# Altium footprint library u025Library.PcbLib: 132 footprints (part 3 of 9)
Each footprint in its own frame and in the unit in brackets; x right, y up, seen from the top. Pads: shape width x height; smd on the part's side, far side on the other; paste and mask are expansions set on the pad; w line width, h text height; cw(c..) or ccw(c..) is an arc to the next point about the centre after c.
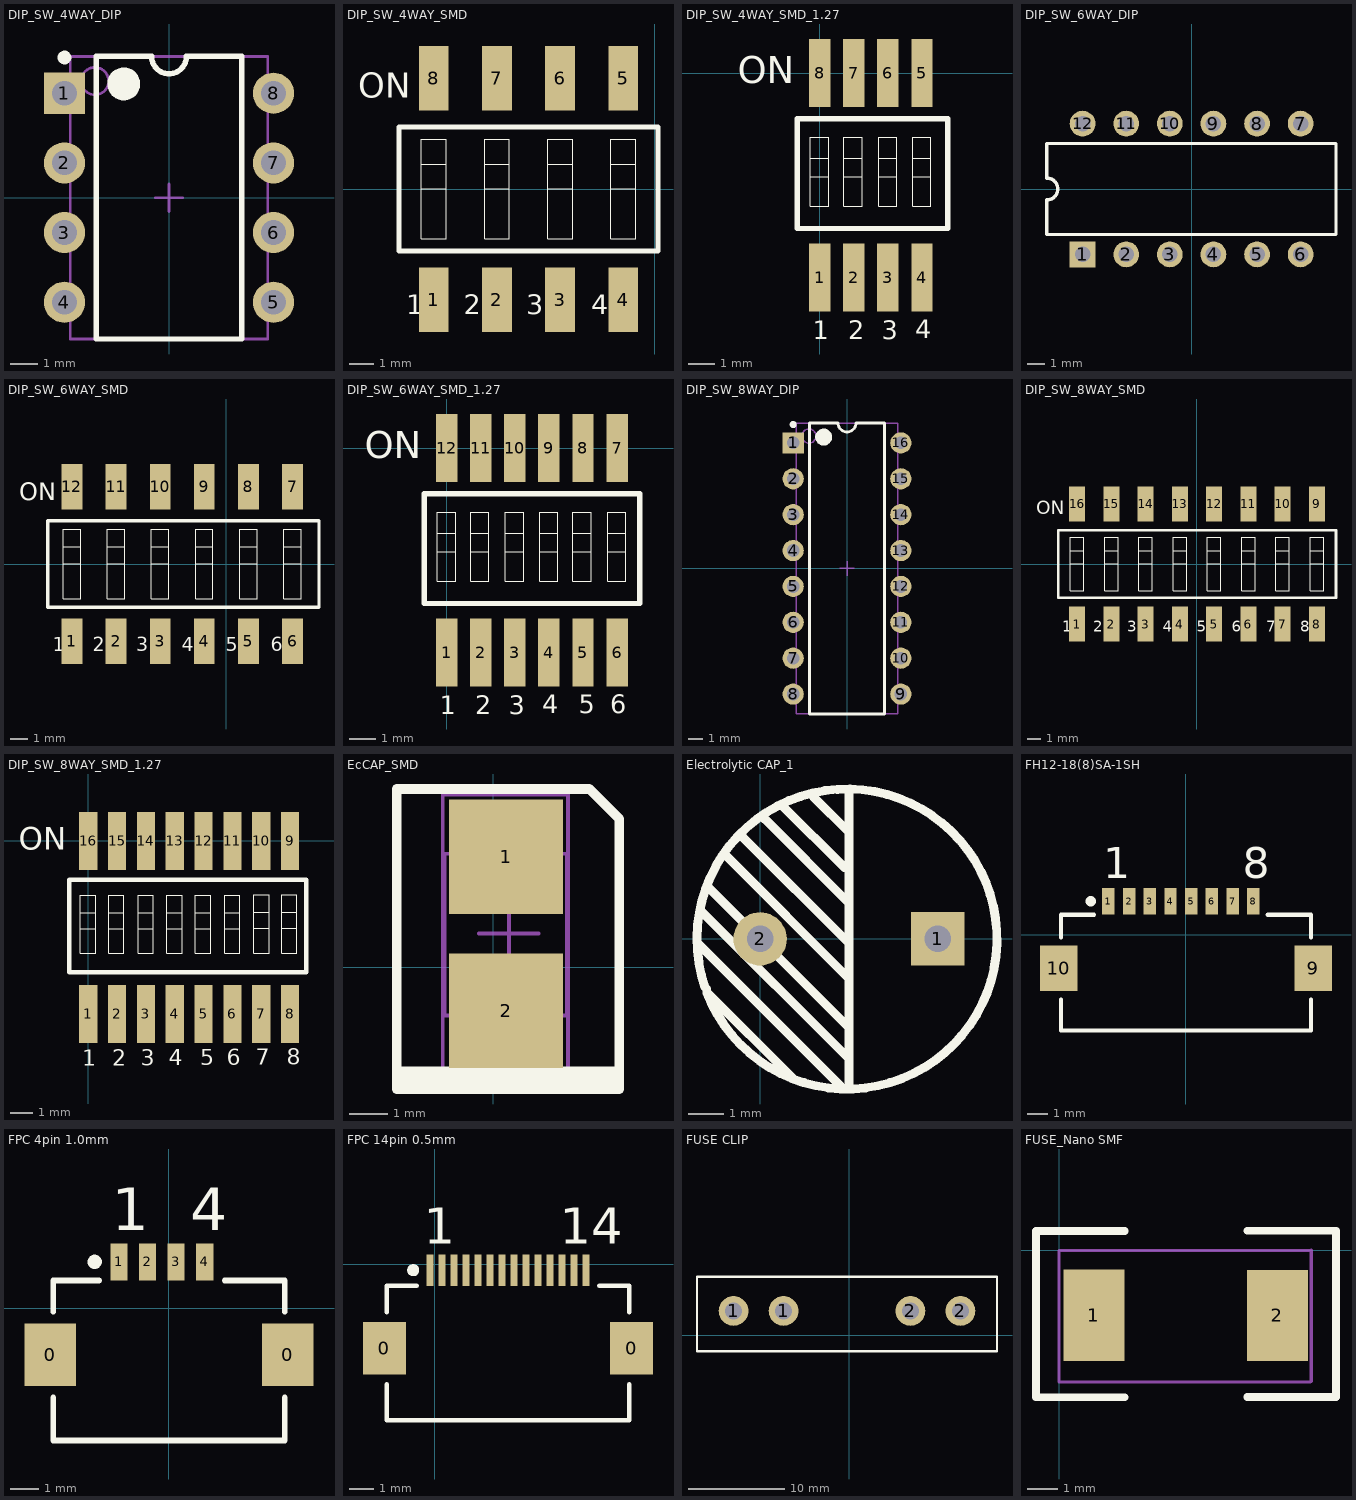
[diagram p2: the footprints below, top view; thin cyan lines are the x and y axes]

## DIP_SW_4WAY_DIP [mm] "DIP; 4 Leads; Row Spacing 7.62 mm; Pitch 2.54 mm"
height 5.08
pads (8):
  rect 1.5x1.5 hole 0.9: 1(-3.81,3.81)
  round 1.5 hole 0.9: 2(-3.81,1.27) 3(-3.81,-1.27) 4(-3.81,-3.81) 5(3.81,-3.81) 6(3.81,-1.27) 7(3.81,1.27) 8(3.81,3.81)
Top Overlay:
  circle w0.25: c-3.81,5.11 r0.125
  circle w0.6: c-1.65,4.15 r0.3
  lines w0.2: -2.65,-5.15 -2.65,5.15 -0.635,5.15 ccw(c0,5.15) 0.635,5.15 2.65,5.15 2.65,-5.15 -2.65,-5.15
Mechanical 13:
  circle w0.1: c-2.7,4.25 r0.5
  lines w0.1: -3.6,-5.15 -3.6,5.15 3.6,5.15 3.6,-5.15 -3.6,-5.15
Mechanical 15:
  lines w0.1: -0.5,0 0.5,0 ; 0,-0.5 0,0.5
3D body: height 3.3, standoff -0.9, extent -3.886,-5.029 3.734,5.131

## DIP_SW_4WAY_SMD [mm] "DIP Switch; 8 Leads"
height 5.06
pads (8):
  rect 1.2x2.6 smd: 1(-8.89,-4.45) 2(-6.35,-4.45) 3(-3.81,-4.45) 4(-1.27,-4.45) 5(-1.27,4.45) 6(-3.81,4.45) 7(-6.35,4.45) 8(-8.89,4.45)
Top Overlay:
  lines w0.025: -9.39,0 -8.39,0 ; -9.39,1 -8.39,1 ; -6.85,0 -5.85,0 ; -6.85,1 -5.85,1 ; -4.31,0 -3.31,0 ; -4.31,1 -3.31,1 ; -1.77,0 -0.77,0 ; -1.77,1 -0.77,1 ; -9.39,-2 -9.39,2 -8.39,2 -8.39,-2 -9.39,-2 ; -6.85,-2 -6.85,2 -5.85,2 -5.85,-2 -6.85,-2 ; -4.31,-2 -4.31,2 -3.31,2 -3.31,-2 -4.31,-2 ; -1.77,-2 -1.77,2 -0.77,2 -0.77,-2 -1.77,-2
  lines w0.2: -10.29,-2.5 -10.29,2.5 0.127,2.5 0.127,-2.5 -10.29,-2.5
  text "4" at -2.556,-5.032 h0.8
  text "3" at -5.181,-5.032 h0.8
  text "2" at -7.681,-5.032 h0.8
  text "1" at -10.006,-5.032 h0.8
  text "ON" at -11.938,3.678 h1
3D body: height 4.32, standoff 0.05, extent -10.793,-4.955 0.837,4.955

## DIP_SW_4WAY_SMD_1.27 [mm] "DIP Switch; 8 Leads"
height 5.06
pads (8):
  rect 0.8x2.54 smd: 1(0,-7.62) 2(1.27,-7.62) 3(2.54,-7.62) 4(3.81,-7.62) 5(3.81,0) 6(2.54,0) 7(1.27,0) 8(0,0)
Top Overlay:
  lines w0.025: -0.348,-3.861 0.33,-3.861 ; -0.348,-3.166 0.33,-3.166 ; 0.897,-3.861 1.575,-3.861 ; 0.897,-3.166 1.575,-3.166 ; 2.192,-3.861 2.87,-3.861 ; 2.192,-3.166 2.87,-3.166 ; 3.462,-3.861 4.14,-3.861 ; 3.462,-3.166 4.14,-3.166 ; -0.348,-4.953 0.33,-4.953 0.33,-2.388 -0.348,-2.388 -0.348,-4.953 ; 0.897,-4.953 1.575,-4.953 1.575,-2.388 0.897,-2.388 0.897,-4.953 ; 2.192,-4.953 2.87,-4.953 2.87,-2.388 2.192,-2.388 2.192,-4.953 ; 3.462,-4.953 3.462,-2.388 4.14,-2.388 4.14,-4.953 3.462,-4.953
  lines w0.2: -0.838,-5.791 -0.838,-1.702 4.775,-1.702 4.775,-5.791 -0.838,-5.791
  text "1" at -0.254,-9.906 h0.7
  text "ON" at -3.048,-0.381 h1
  text "2" at 1.067,-9.906 h0.7
  text "3" at 2.311,-9.906 h0.7
  text "4" at 3.556,-9.881 h0.7
3D body: height 2.35, standoff 0, extent -1.124,-7.8 5.086,0.333

## DIP_SW_6WAY_DIP [mm] "DIP; 12 Leads; Row Spacing 7.62 mm; Pitch 2.54 mm"
height 5.8
pads (12):
  rect 1.5x1.5 hole 0.9: 1(-6.35,-3.81)
  round 1.5 hole 0.9: 2(-3.81,-3.81) 3(-1.27,-3.81) 4(1.27,-3.81) 5(3.81,-3.81) 6(6.35,-3.81) 7(6.35,3.81) 8(3.81,3.81) 9(1.27,3.81) 10(-1.27,3.81) 11(-3.81,3.81) 12(-6.35,3.81)
Top Overlay:
  lines w0.2: -8.43,-2.65 8.41,-2.65 8.41,2.65 -8.43,2.65 -8.43,0.635 cw(c-8.43,0) -8.43,-0.635 -8.43,-2.65
3D body: height 3.3, standoff -0.9, extent -7.569,-3.785 7.671,3.835

## DIP_SW_6WAY_SMD [mm] "DIP Switch; 12 Leads"
height 5.06
pads (12):
  rect 1.2x2.6 smd: 1(-8.89,-4.45) 2(-6.35,-4.45) 3(-3.81,-4.45) 4(-1.27,-4.45) 5(1.27,-4.45) 6(3.81,-4.45) 7(3.81,4.45) 8(1.27,4.45) 9(-1.27,4.45) 10(-3.81,4.45) 11(-6.35,4.45) 12(-8.89,4.45)
Top Overlay:
  lines w0.025: -9.39,0 -8.39,0 ; -9.39,1 -8.39,1 ; -6.85,0 -5.85,0 ; -6.85,1 -5.85,1 ; -4.31,0 -3.31,0 ; -4.31,1 -3.31,1 ; -1.77,0 -0.77,0 ; -1.77,1 -0.77,1 ; 0.77,0 1.77,0 ; 0.77,1 1.77,1 ; 3.31,0 4.31,0 ; 3.31,1 4.31,1 ; -9.39,-2 -9.39,2 -8.39,2 -8.39,-2 -9.39,-2 ; -6.85,-2 -6.85,2 -5.85,2 -5.85,-2 -6.85,-2 ; -4.31,-2 -4.31,2 -3.31,2 -3.31,-2 -4.31,-2 ; -1.77,-2 -1.77,2 -0.77,2 -0.77,-2 -1.77,-2 ; 0.77,-2 0.77,2 1.77,2 1.77,-2 0.77,-2 ; 3.31,-2 3.31,2 4.31,2 4.31,-2 3.31,-2
  lines w0.2: -10.29,-2.5 -10.29,2.5 5.334,2.5 5.334,-2.5 -10.29,-2.5
  text "6" at 2.569,-5.032 h0.8
  text "5" at -0.031,-5.032 h0.8
  text "4" at -2.556,-5.032 h0.8
  text "3" at -5.181,-5.032 h0.8
  text "2" at -7.681,-5.032 h0.8
  text "1" at -10.006,-5.032 h0.8
  text "ON" at -11.938,3.678 h1
3D body: height 4.3, standoff 0.1, extent -10.185,-3.734 5.055,3.886

## DIP_SW_6WAY_SMD_1.27 [mm] "DIP Switch; 12 Leads"
height 5.06
pads (12):
  rect 0.8x2.54 smd: 1(0,-7.62) 2(1.27,-7.62) 3(2.54,-7.62) 4(3.81,-7.62) 5(5.08,-7.62) 6(6.35,-7.62) 7(6.35,0) 8(5.08,0) 9(3.81,0) 10(2.54,0) 11(1.27,0) 12(0,0)
Top Overlay:
  lines w0.025: -0.348,-3.861 0.33,-3.861 ; -0.348,-3.166 0.33,-3.166 ; 0.897,-3.861 1.575,-3.861 ; 0.897,-3.166 1.575,-3.166 ; 2.192,-3.861 2.87,-3.861 ; 2.192,-3.166 2.87,-3.166 ; 3.462,-3.861 4.14,-3.861 ; 3.462,-3.166 4.14,-3.166 ; 4.707,-3.861 5.385,-3.861 ; 4.707,-3.166 5.385,-3.166 ; 6.002,-3.861 6.68,-3.861 ; 6.002,-3.166 6.68,-3.166 ; -0.348,-4.953 -0.348,-2.388 0.33,-2.388 0.33,-4.953 -0.348,-4.953 ; 0.897,-4.953 0.897,-2.388 1.575,-2.388 1.575,-4.953 0.897,-4.953 ; 2.192,-4.953 2.192,-2.388 2.87,-2.388 2.87,-4.953 2.192,-4.953 ; 3.462,-4.953 4.14,-4.953 4.14,-2.388 3.462,-2.388 3.462,-4.953 ; 4.707,-4.953 5.385,-4.953 5.385,-2.388 4.707,-2.388 4.707,-4.953 ; 6.002,-4.953 6.68,-4.953 6.68,-2.388 6.002,-2.388 6.002,-4.953
  lines w0.2: -0.838,-5.791 7.188,-5.791 7.188,-1.702 -0.838,-1.702 -0.838,-5.791
  text "5" at 4.928,-9.881 h0.7
  text "6" at 6.096,-9.881 h0.7
  text "4" at 3.556,-9.881 h0.7
  text "3" at 2.311,-9.906 h0.7
  text "2" at 1.067,-9.906 h0.7
  text "ON" at -3.048,-0.381 h1
  text "1" at -0.254,-9.906 h0.7
3D body: height 2.35, standoff 0, extent -1.175,-7.749 7.575,0.383

## DIP_SW_8WAY_DIP [mm] "DIP; 16 Leads; Row Spacing 7.62 mm; Pitch 2.54 mm"
height 5.08
pads (16):
  rect 1.5x1.5 hole 0.9: 1(-3.81,8.89)
  round 1.5 hole 0.9: 2(-3.81,6.35) 3(-3.81,3.81) 4(-3.81,1.27) 5(-3.81,-1.27) 6(-3.81,-3.81) 7(-3.81,-6.35) 8(-3.81,-8.89) 9(3.81,-8.89) 10(3.81,-6.35) 11(3.81,-3.81) 12(3.81,-1.27) 13(3.81,1.27) 14(3.81,3.81) 15(3.81,6.35) 16(3.81,8.89)
Top Overlay:
  circle w0.25: c-3.81,10.19 r0.125
  circle w0.6: c-1.65,9.3 r0.3
  lines w0.2: -2.65,-10.3 -2.65,10.3 -0.635,10.3 ccw(c0,10.3) 0.635,10.3 2.65,10.3 2.65,-10.3 -2.65,-10.3
Mechanical 13:
  circle w0.1: c-2.7,9.375 r0.5
  lines w0.1: -3.6,-10.275 -3.6,10.275 3.6,10.275 3.6,-10.275 -3.6,-10.275
Mechanical 15:
  lines w0.1: -0.5,0 0.5,0 ; 0,-0.5 0,0.5
3D body: height 3.3, standoff -0.9, extent -3.708,-10.185 3.912,10.135

## DIP_SW_8WAY_SMD [mm] "DIP Switch; 16 Leads"
height 5.06
pads (16):
  rect 1.2x2.6 smd: 1(-8.89,-4.45) 2(-6.35,-4.45) 3(-3.81,-4.45) 4(-1.27,-4.45) 5(1.27,-4.45) 6(3.81,-4.45) 7(6.35,-4.45) 8(8.89,-4.45) 9(8.89,4.45) 10(6.35,4.45) 11(3.81,4.45) 12(1.27,4.45) 13(-1.27,4.45) 14(-3.81,4.45) 15(-6.35,4.45) 16(-8.89,4.45)
Top Overlay:
  lines w0.025: -9.39,0 -8.39,0 ; -9.39,1 -8.39,1 ; -6.85,0 -5.85,0 ; -6.85,1 -5.85,1 ; -4.31,0 -3.31,0 ; -4.31,1 -3.31,1 ; -1.77,0 -0.77,0 ; -1.77,1 -0.77,1 ; 0.77,0 1.77,0 ; 0.77,1 1.77,1 ; 3.31,0 4.31,0 ; 3.31,1 4.31,1 ; 5.85,0 6.85,0 ; 5.85,1 6.85,1 ; 8.39,0 9.39,0 ; 8.39,1 9.39,1 ; -9.39,-2 -9.39,2 -8.39,2 -8.39,-2 -9.39,-2 ; -6.85,-2 -6.85,2 -5.85,2 -5.85,-2 -6.85,-2 ; -4.31,-2 -4.31,2 -3.31,2 -3.31,-2 -4.31,-2 ; -1.77,-2 -1.77,2 -0.77,2 -0.77,-2 -1.77,-2 ; 0.77,-2 0.77,2 1.77,2 1.77,-2 0.77,-2 ; 3.31,-2 3.31,2 4.31,2 4.31,-2 3.31,-2 ; 5.85,-2 5.85,2 6.85,2 6.85,-2 5.85,-2 ; 8.39,-2 8.39,2 9.39,2 9.39,-2 8.39,-2
  lines w0.2: -10.29,-2.5 -10.29,2.5 10.31,2.5 10.31,-2.5 -10.29,-2.5
  text "6" at 2.569,-5.032 h0.8
  text "5" at -0.031,-5.032 h0.8
  text "4" at -2.556,-5.032 h0.8
  text "3" at -5.181,-5.032 h0.8
  text "2" at -7.681,-5.032 h0.8
  text "1" at -10.006,-5.032 h0.8
  text "ON" at -11.938,3.678 h1
  text "7" at 5.119,-5.032 h0.8
  text "8" at 7.659,-5.032 h0.8
3D body: height 4.3, standoff 0.1, extent -10.185,-4.091 10.135,3.529

## DIP_SW_8WAY_SMD_1.27 [mm] "DIP Switch; 16 Leads"
height 5.06
pads (16):
  rect 0.8x2.54 smd: 1(0,-7.62) 2(1.27,-7.62) 3(2.54,-7.62) 4(3.81,-7.62) 5(5.08,-7.62) 6(6.35,-7.62) 7(7.62,-7.62) 8(8.89,-7.62) 9(8.89,0) 10(7.62,0) 11(6.35,0) 12(5.08,0) 13(3.81,0) 14(2.54,0) 15(1.27,0) 16(0,0)
Top Overlay:
  lines w0.025: -0.348,-3.861 0.33,-3.861 ; -0.348,-3.166 0.33,-3.166 ; 0.897,-3.861 1.575,-3.861 ; 0.897,-3.166 1.575,-3.166 ; 2.192,-3.861 2.87,-3.861 ; 2.192,-3.166 2.87,-3.166 ; 3.462,-3.861 4.14,-3.861 ; 3.462,-3.166 4.14,-3.166 ; 4.707,-3.861 5.385,-3.861 ; 4.707,-3.166 5.385,-3.166 ; 6.002,-3.861 6.68,-3.861 ; 6.002,-3.166 6.68,-3.166 ; 7.29,-3.845 7.968,-3.845 ; 7.29,-3.15 7.968,-3.15 ; 8.509,-3.845 9.187,-3.845 ; 8.509,-3.15 9.187,-3.15 ; -0.348,-4.953 0.33,-4.953 0.33,-2.388 -0.348,-2.388 -0.348,-4.953 ; 0.897,-4.953 1.575,-4.953 1.575,-2.388 0.897,-2.388 0.897,-4.953 ; 2.192,-4.953 2.87,-4.953 2.87,-2.388 2.192,-2.388 2.192,-4.953 ; 3.462,-4.953 3.462,-2.388 4.14,-2.388 4.14,-4.953 3.462,-4.953 ; 4.707,-4.953 4.707,-2.388 5.385,-2.388 5.385,-4.953 4.707,-4.953 ; 6.002,-4.953 6.002,-2.388 6.68,-2.388 6.68,-4.953 6.002,-4.953 ; 7.29,-4.937 7.968,-4.937 7.968,-2.372 7.29,-2.372 7.29,-4.937 ; 8.509,-4.937 8.509,-2.372 9.187,-2.372 9.187,-4.937 8.509,-4.937
  lines w0.2: -0.838,-5.791 -0.838,-1.702 9.601,-1.702 9.601,-5.791 -0.838,-5.791
  text "1" at -0.254,-9.906 h0.7
  text "ON" at -3.048,-0.381 h1
  text "2" at 1.067,-9.906 h0.7
  text "3" at 2.311,-9.906 h0.7
  text "4" at 3.556,-9.881 h0.7
  text "8" at 8.738,-9.855 h0.7
  text "7" at 7.366,-9.855 h0.7
  text "6" at 6.096,-9.881 h0.7
  text "5" at 4.928,-9.881 h0.7
3D body: height 2.4, standoff 0, extent -1.179,-7.961 10.121,0.239

## EcCAP_SMD [mm] "EcCAP SMD 4x5x5mm"
height 5
pads (2):
  rect 3x3 smd: 1(0.33,2.896) 2(0.33,-1.143)
Top Overlay:
  lines w0.254: 3.099,-2.896 2.921,-2.896 ; 3.15,-3.048 2.769,-3.048 ; 3.251,-2.743 2.921,-2.743 -2.464,-2.743 -2.311,-2.896 2.921,-2.896 ; -2.54,-3.2 -2.54,4.674 2.515,4.674 3.302,3.886 3.302,-3.2 -2.54,-3.2 ; -2.54,-3.2 -2.388,-3.048 2.769,-3.048 ; 2.769,-3.048 2.921,-2.896
Mechanical 13:
  lines w0.1: -1.288,-1.27 1.93,-1.27 1.93,2.972 -1.288,2.972 -1.288,-1.27
Mechanical 15:
  lines w0.1: -0.388,0.878 1.181,0.878 ; 0.406,-0.15 0.406,1.93 ; -1.333,-2.769 1.956,-2.769 1.956,4.521 -1.333,4.521 -1.333,-2.769
3D body: height 5.52, standoff -0.4, extent -2.337,-2.261 2.997,3.835

## Electrolytic CAP_1 [mil] "Electrolytic CAP_1"
pads (2):
  rect 60x60 hole 30: 1(200,0)
  round 60 hole 30: 2(0,0)
Top Overlay:
  lines w10: -70,-5 90,-165 ; -65,30 100,-135 ; -62.14,-54.03 cw(c97.74,-0.11) -60,-60 ; -60,-56.17 -60,-60 ; -60,60 100,-100 ; -40,95 100,-45 ; -25,115 -20,115 100,-5 ; 5,135 100,40 100,35 ; 25,150 95,80 ; 36.5,-156.5 -60,-60 ; 60,160 100,120 ; 100,-165 100,165 ; 100,70 100,90 ; -60,-60 -60,-60
3D body: height 1000, standoff -1131.89, extent -162,-260.84 357.69,258.84

## FH12-18(8)SA-1SH [mm] "Connector; FH12 Series; 8 Position; 1.0mm Spaced Bottom Eccentric Contact"
height 2
pads (10):
  rect 0.6x1.3 smd: 1(-3.75,1.625) 2(-2.75,1.625) 3(-1.75,1.625) 4(-0.75,1.625) 5(0.25,1.625) 6(1.25,1.625) 7(2.25,1.625) 8(3.25,1.625)
  rect 1.8x2.2 smd: 9(6.15,-1.625) 10(-6.15,-1.625)
Top Overlay:
  circle w0.25: c-4.6,1.625 r0.125
  lines w0.2: -6.05,-3.125 -6.05,-4.625 6.05,-4.625 6.05,-3.125 ; -6.05,-0.125 -6.05,0.975 -4.45,0.975 ; 3.95,0.975 6.05,0.975 6.05,-0.125
  text "8" at 2.75,2.725 h1.5
  text "1" at -4,2.725 h1.5
3D body: height 2.7, standoff -0.1, extent -7.766,-4.737 7.234,1.773

## FPC 4pin 1.0mm [mm] "Connector; FH12 Series; 4 Position; 1.0mm Spaced Bottom Eccentric Contact"
height 2
pads (6):
  rect 1.8x2.2 smd: 0(-4.15,-1.625) 0(4.15,-1.625)
  rect 0.6x1.3 smd: 1(-1.75,1.625) 2(-0.75,1.625) 3(0.25,1.625) 4(1.25,1.625)
Top Overlay:
  circle w0.25: c-2.6,1.625 r0.125
  lines w0.2: -4.05,-3.125 -4.05,-4.625 4.05,-4.625 4.05,-3.125 ; -4.05,-0.125 -4.05,0.975 -2.45,0.975 ; 1.95,0.975 4.05,0.975 4.05,-0.125
  text "4" at 0.75,2.725 h1.5
  text "1" at -2,2.725 h1.5
3D body: height 2.7, standoff -0.1, extent -5.749,-4.882 5.251,1.628

## FPC 14pin 0.5mm [mm] "Connector; FH12 Series; 14 Position; 0.5mm Spaced Bottom Eccentric Contact"
height 2
pads (16):
  rect 1.8x2.2 smd: 0(-2.091,-3.5) 0(8.209,-3.5)
  rect 0.3x1.3 smd: 1(-0.191,-0.25) 2(0.309,-0.25) 3(0.809,-0.25) 4(1.309,-0.25) 5(1.809,-0.25) 6(2.309,-0.25) 7(2.809,-0.25) 8(3.309,-0.25) 9(3.809,-0.25) 10(4.309,-0.25) 11(4.809,-0.25) 12(5.309,-0.25) 13(5.809,-0.25) 14(6.309,-0.25)
Top Overlay:
  circle w0.25: c-0.891,-0.25 r0.125
  lines w0.2: -1.991,-5 -1.991,-6.5 8.109,-6.5 8.109,-5 ; -1.991,-2 -1.991,-0.9 -0.741,-0.9 ; 6.859,-0.9 8.109,-0.9 8.109,-2
  text "14" at 5.209,0.85 h1.5
  text "1" at -0.441,0.85 h1.5
3D body: height 2.2, standoff -0.05, extent -2.534,-6.313 8.566,0.186

## FUSE CLIP [mm]
pads (4):
  round 3.1 hole 1.8: 1(-12.065,2.54) 1(-6.858,2.54) 2(6.35,2.54) 2(11.557,2.54)
Top Overlay:
  lines w0.254: -15.875,-1.651 15.367,-1.651 15.367,6.096 -15.875,6.096 -15.875,-1.524
3D body: height 4.6, standoff -0.4, extent -10.791,0.512 9.209,5.512

## FUSE_Nano SMF [mm] "FUSE Nano SMF"
pads (2):
  rect 2x3 smd: 1(1.143,-2.134) 2(7.169,-2.135)
Top Overlay:
  lines w0.254: 2.159,-4.826 -0.762,-4.826 -0.762,0.635 2.159,0.635 ; 6.176,-4.813 9.097,-4.813 9.097,0.648 6.176,0.648
Mechanical 15:
  lines w0.1: 8.263,-4.318 0,-4.318 0,0 8.284,0 ; 8.284,-4.305 8.284,0.013
3D body: height 2.7, standoff 0, extent 1.057,-3.484 7.157,-0.784